# Altium footprint library 7.Connectors&Battary_holders.PcbLib: 133 footprints (part 9 of 9)
Each footprint in its own frame and in the unit in brackets; x right, y up, seen from the top. Pads: shape width x height; smd on the part's side, far side on the other; paste and mask are expansions set on the pad; w line width, h text height; cw(c..) or ccw(c..) is an arc to the next point about the centre after c.
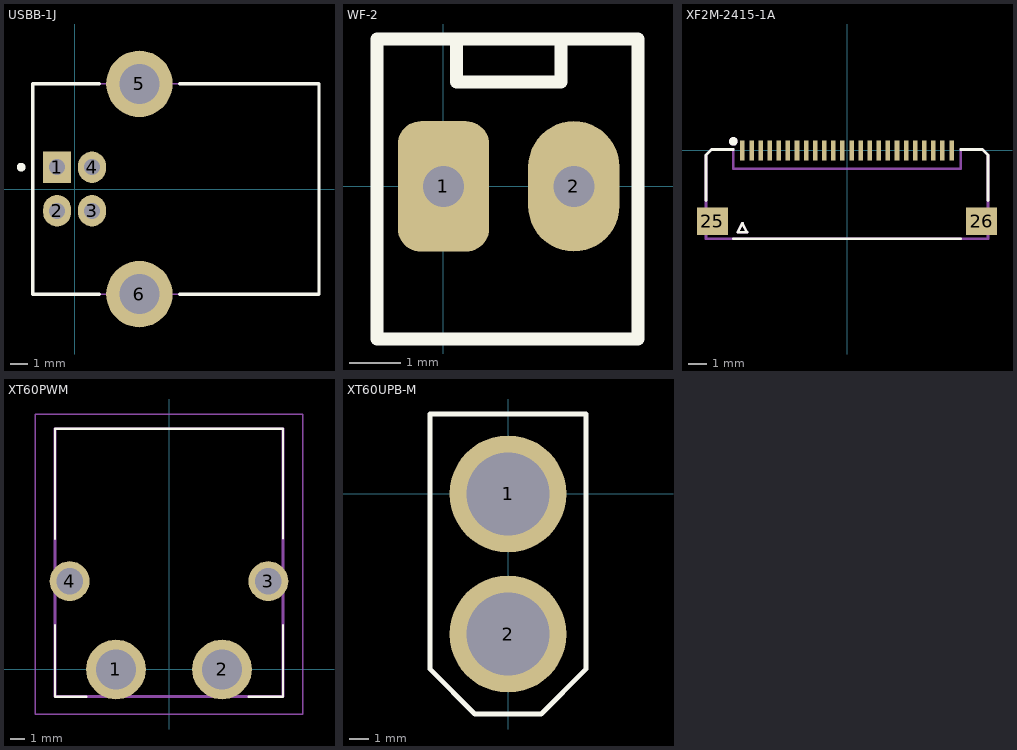
[diagram p8: the footprints below, top view; thin cyan lines are the x and y axes]

## USBB-1J [mm] "Разъем USB (м) на плату, тип B"
height 11.1
pads (6):
  rect 1.6x1.8 hole 0.92: 1(-1,1.25)
  oval 1.6x1.8 hole 0.92: 2(-1,-1.25) 3(1,-1.25) 4(1,1.25)
  round 3.8 hole 2.3: 5(3.71,6.02) 6(3.71,-6.02)
Top Overlay:
  circle w0.25: c-3.06,1.25 r0.125
  lines w0.2: 1.41,-6.02 -2.41,-6.02 -2.41,6.02 1.41,6.02 ; 6.01,-6.02 13.99,-6.02 13.99,6.02 6.01,6.02
Mechanical 13:
  lines w0.1: -2.41,-6.02 -2.41,6.02 13.99,6.02 13.99,-6.02 -2.41,-6.02
3D body "Samtec-USBR-B-F-S-O-TH.STEP": height 11.1, standoff -3.62, extent -2.286,-7.449 14.014,7.449

## WF-2 [mm] "Разъем питания 2 конт.(п) шаг 2,54 на плату"
height 2.3
pads (2):
  rrect50% 1.778x2.54 hole 0.8: 1(0,0)
  oval 1.778x2.54 hole 0.8: 2(2.54,0)
Top Overlay:
  lines w0.254: 0.254,2.794 0.254,2.032 2.286,2.032 2.286,2.794 ; -1.295,-2.972 3.785,-2.972 3.785,2.87 -1.295,2.87 -1.295,-2.972
3D body "WF-2.STEP": height 11.87, standoff -3.37, extent -1.295,-2.972 3.785,2.87

## XF2M-2415-1A [mm]
pads (26):
  rect 0.25x1.1 smd: 1(-5.75,0) 2(-5.25,0) 3(-4.75,0) 4(-4.25,0) 5(-3.75,0) 6(-3.25,0) 7(-2.75,0) 8(-2.25,0) 9(-1.75,0) 10(-1.25,0) 11(-0.75,0) 12(-0.25,0) 13(0.25,0) 14(0.75,0) 15(1.25,0) 16(1.75,0) 17(2.25,0) 18(2.75,0) 19(3.25,0) 20(3.75,0) 21(4.25,0) 22(4.75,0) 23(5.25,0) 24(5.75,0)
  rect 1.7x1.5 smd: 25(-7.4,-3.9) 26(7.4,-3.9)
Top Overlay:
  circle w0.25: c-6.25,0.5 r0.112
  lines w0.15: -7.75,-2.75 -7.75,-0.25 -7.45,0.05 -6.25,0.05 ; -6.25,-4.85 6.25,-4.85 ; 6.25,0.05 7.45,0.05 7.75,-0.25 7.75,-2.75 ; -6,-4.5 -5.5,-4.5 -5.75,-4 -6,-4.5
Mechanical 13:
  circle w0.25: c-6.25,0.5 r0.112
  lines w0.15: -7.75,-4.85 7.75,-4.85 7.75,-0.25 7.45,0.05 6.25,0.05 6.25,-1 -6.25,-1 -6.25,0.05 -7.45,0.05 -7.75,-0.25 -7.75,-4.85 ; -6,-4.5 -5.5,-4.5 -5.75,-4 -6,-4.5
3D body "xf2m-2415-1a.stp": height 2, standoff 0, extent -8.05,-5 8.05,0.9

## XT60PWM [mm]
pads (4):
  round 4.05 hole 2.7: 1(-3.6,0) 2(3.6,0)
  round 2.7 hole 1.8: 3(6.75,6) 4(-6.75,6)
Top Overlay:
  lines w0.15: -7.75,3 -7.75,-1.85 -5.6,-1.85 ; -7.75,8.875 -7.75,16.35 7.75,16.35 7.75,8.9 ; 5.4,-1.85 7.75,-1.85 7.75,3
Mechanical 13:
  lines w0.2: -7.75,-1.85 7.75,-1.85 7.75,16.35 -7.75,16.35 -7.75,-1.85
Mechanical 15:
  lines w0.1: -9.1,-3.025 9.1,-3.025 9.1,17.35 -9.1,17.35 -9.1,-3.025
3D body "XT60PW-M.stp": height 8.44, standoff -2.51, extent -7.95,-1.98 7.95,16.298

## XT60UPB-M [mm]
pads (2):
  round 6 hole 4.25: 1(0,0) 2(0,-7.2)
Top Overlay:
  lines w0.254: -4,-9 -1.7,-11.3 1.7,-11.3 4,-9 4,4.1 -4,4.1 -4,-9
3D body "User Library-XT60UPB Fem Vert.STEP": height 13.54, standoff -2.06, extent -3.95,-11.292 3.95,4.05